# Altium integrated library Supernova Connectors.IntLib: 270 symbols (part 1 of 2) (continued)
## DF40C-40DS-0.4V(51) (continued)

## DF40C-100DS-0.4V(51)
designator J?
CONN RCPT 100POS SMD GOLD; Manufacturer_Name: Hirose; Datasheet Link: https://datasheet.datasheetarchive.com/originals/distributors/SFDatasheet-7/sf-000141247.pdf; Manufacturer_Part_Number: DF40C-100DS-0.4V(51); Mouser Part Number: 798-DF40C100DS0.4V51; Mouser Price/Stock: https://www.mouser.co.uk/ProductDetail/Hirose-Connector/DF40C-100DS-0.4V51?qs=eDUdFcBPps2MEwbnuPvZzQ%3D%3D; Arrow Part Number: DF40C-100DS-0.4V(51); Arrow Price/Stock: https://www.arrow.com/en/products/df40c-100ds-0.4v-51/hirose-electric; Supplier 1: Mouser; Supplier 2: Digi-Key; Supplier Part Number 1: 798-DF40C30DP0.4V51; Supplier Part Number 2: H11622CT-ND
footprint DF40C100DS04V51
pins: 1, 2, 3, 4, 5, 6, 7, 8, 9, 10, 11, 12, 13, 14, 15, 16, 17, 18, 19, 20, 21, 22, 23, 24, 25, 26, 27, 28, 29, 30, 31, 32, 33, 34, 35, 36, 37, 38, 39, 40, 41, 42, 43, 44, 45, 46, 47, 48, 49, 50, 51, 52, 53, 54, 55, 56, 57, 58, 59, 60, 61, 62, 63, 64, 65, 66, 67, 68, 69, 70, 71, 72, 73, 74, 75, 76, 77, 78, 79, 80, 81, 82, 83, 84, 85, 86, 87, 88, 89, 90, 91, 92, 93, 94, 95, 96, 97, 98, 99, 100

## DM3AT-SF-PEJM5
designator J?
Receptacle  Micro SD - Push-Push; Manufacturer: Hirose; Manufacturer Part Number: DM3AT-SF-PEJM5; Supplier 1: Digi-Key; Supplier Part Number 1: HR1964CT-ND; Supplier 2: Mouser; Supplier Part Number 2: 798-DM3AT-SF-PEJM5
footprint HIROSE DM3AT
pins: 1 DAT2, 2 DAT3, 3 CMD, 4 VDD, 5 CLK, 6 VSS, 7 DAT0, 8 DAT1, A CD, B CD, F FIX

## ED555/5DS
designator J?
Header Screw terminal 5 pins; Supplier 1: Digi-Key; Supplier Part Number 1: ED1517-ND; Supplier 2: Newark; Supplier Part Number 2: 85X2493
footprint ED555/5DS
pins: 1, 2, 3, 4, 5

## ESQ-102-37-G-D
designator H?
Header 4 Pin ESQ; System: Connector; Supplier 1: Digi-Key; Supplier Part Number 1: ESQ-102-37-G-D-ND; Supplier 2: Newark; Supplier Part Number 2: 91P8641
footprint ESQ-102-37-G-D
pins: 1, 2, 3, 4

## ESQ-110-23-G-D
designator H?
Header 10x2 pin; Manufacturer_Name: SAMTEC; Manufacturer_Part_Number: ESQ-110-23-L-D; Datasheet Link: http://suddendocs.samtec.com/prints/esq-1xx-xx-x-x-xxx-xx-x-xx-mkt.pdf; Supplier 1: Digi-Key; Supplier Part Number 1: SAM15578-ND
footprint ESQ-110-23-G-D (ESQ-126-37-G-D Samtech 52-pin connector)
footprint ESQ-110-23-G-D - FLIPPED (ESQ-126-37-G-D Samtech 52-pin connector)
pins: 1, 2, 3, 4, 5, 6, 7, 8, 9, 10, 11, 12, 13, 14, 15, 16, 17, 18, 19, 20

## ESQ-110-33-L-D
designator H?
Header 10x2 Pin; Manufacturer_Name: SAMTEC; Manufacturer_Part_Number: SSW-110-01-G-D; Datasheet Link: http://suddendocs.samtec.com/prints/ssw-1xx-xx-xxx-x-xx-xxx-xx-mkt.pdf; Mouser Part Number: 200-SSW11001GD; Mouser Price/Stock: https://www.mouser.co.uk/ProductDetail/Samtec/SSW-110-01-G-D?qs=H3VknL1Rk7SPuUvNV9ez4g%3D%3D; Arrow Part Number: SSW-110-01-G-D; Arrow Price/Stock: https://www.arrow.com/en/products/ssw-110-01-g-d/samtec; Supplier 1: Digi-Key; Supplier Part Number 1: ESQ-110-33-L-D-ND
footprint SSW-110-XX-YYY-D
pins: 1, 2, 3, 4, 5, 6, 7, 8, 9, 10, 11, 12, 13, 14, 15, 16, 17, 18, 19, 20

## ESQ-110-37-G-D
designator H1
Header PC/104 20-pin; System: Connector; Supplier 1: Digi-Key; Supplier Part Number 1: ESQ-110-37-G-D-ND; Supplier 2: Newark; Supplier Part Number 2: 91P9697
footprint ESQ-110-37-G-D (ESQ-126-37-G-D Samtech 52-pin connector)
footprint ESQ-110-37-G-D - flipped (ESQ-126-37-G-D Samtech 52-pin connector)
pins: 1, 2, 3, 4, 5, 6, 7, 8, 9, 10, 11, 12, 13, 14, 15, 16, 17, 18, 19, 20

## ESQ-112-37-G-D
designator H?
Header PC/104 24-pin; System: Connector; Supplier 1: Digi-Key; Supplier Part Number 1: ESQ-112-37-G-D-ND; Supplier 2: Digi-Key; Supplier Part Number 2: ESQ-112-37-S-D-ND
footprint ESQ-112-37-G-D (ESQ-126-37-G-D Samtech 52-pin connector)
footprint ESQ-112-37-G-D - flipped (ESQ-126-37-G-D Samtech 52-pin connector)
pins: 1, 2, 3, 4, 5, 6, 7, 8, 9, 10, 11, 12, 13, 14, 15, 16, 17, 18, 19, 20, 21, 22, 23, 24

## Fiducial
designator FID?  (value not drawn)  (no BOM)
Fiducial Mark
footprint Fiducial
footprint Fiducial - WITH PASTE
pins: 1

## FTS-115-02-L-DV-A
designator H?
Header 30 Pin FTS; System: Connector*; Supplier 1: Mouser; Supplier 2: Digi-Key; Supplier Part Number 1: 200-FTS11502LDVA; Supplier Part Number 2: FTS-115-02-L-DV-A-ND
footprint FTS-115-02-L-DV-A
pins: 1, 2, 3, 4, 5, 6, 7, 8, 9, 10, 11, 12, 13, 14, 15, 16, 17, 18, 19, 20, 21, 22, 23, 24, 25, 26, 27, 28, 29, 30

## FTS-129-02-L-DV-A
designator H?
Header 58 Pin FTS; System: Connector; Supplier 1: Digi-Key; Supplier Part Number 1: FTS-129-02-L-DV-A-ND
footprint FTS-129-02-L-DV-A
pins: 1, 2, 3, 4, 5, 6, 7, 8, 9, 10, 11, 12, 13, 14, 15, 16, 17, 18, 19, 20, 21, 22, 23, 24, 25, 26, 27, 28, 29, 30, 31, 32, 33, 34, 35, 36, 37, 38, 39, 40, 41, 42, 43, 44, 45, 46, 47, 48, 49, 50, 51, 52, 53, 54, 55, 56, 57, 58

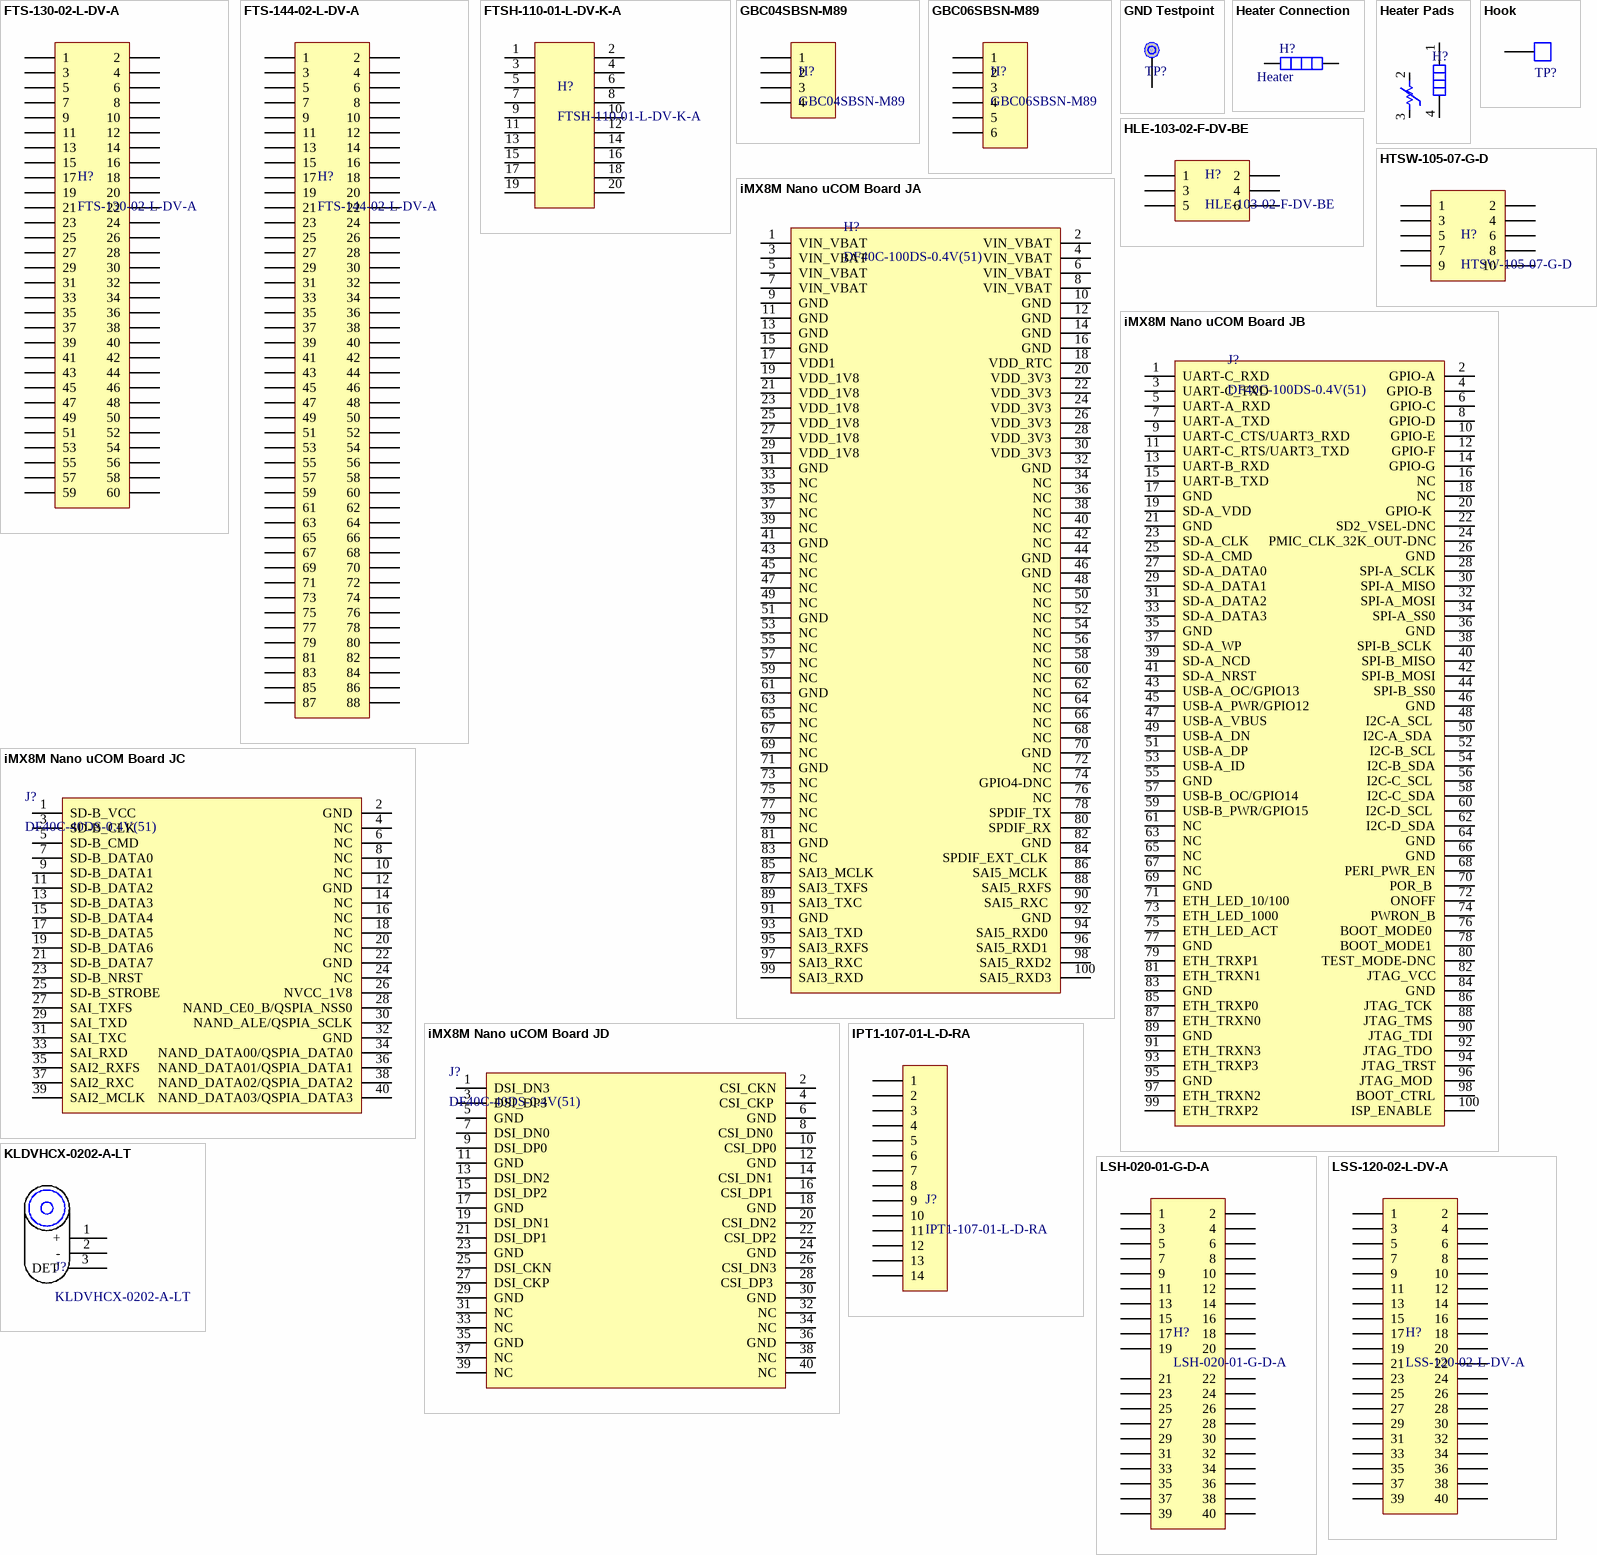
[diagram p4: symbols FTS-130-02-L-DV-A to LSS-120-02-L-DV-A]

## FTS-130-02-L-DV-A
designator H?
Header 60 Pin FTS; System: Connector; Supplier 1: Avnet; Supplier Part Number 1: FTS-130-02-L-DV-A; Supplier 2: Digi-Key; Supplier Part Number 2: FTS-130-02-L-DV-A-ND; Supplier 3: Newark; Supplier Part Number 3: 96AC0110; Supplier 4: Mouser; Supplier Part Number 4: 200-FTS13002LDVA; Supplier 5: Avnet; Supplier Part Number 5: FTS-130-02-L-DV; Supplier 6: Samtec; Supplier Part Number 6: FTS-130-02-L-DV
footprint FTS-130-02-L-DV-A
pins: 1, 2, 3, 4, 5, 6, 7, 8, 9, 10, 11, 12, 13, 14, 15, 16, 17, 18, 19, 20, 21, 22, 23, 24, 25, 26, 27, 28, 29, 30, 31, 32, 33, 34, 35, 36, 37, 38, 39, 40, 41, 42, 43, 44, 45, 46, 47, 48, 49, 50, 51, 52, 53, 54, 55, 56, 57, 58, 59, 60

## FTS-144-02-L-DV-A
designator H?
Header 88 Pin FTS; System: Connector; Supplier 1: Digi-Key; Supplier 2: Digi-Key; Supplier Part Number 1: FTS-144-02-FM-DV-ND; Supplier Part Number 2: FTS-144-02-S-DV-ND
footprint FTS-144-02-L-DV-A
pins: 1, 2, 3, 4, 5, 6, 7, 8, 9, 10, 11, 12, 13, 14, 15, 16, 17, 18, 19, 20, 21, 22, 23, 24, 25, 26, 27, 28, 29, 30, 31, 32, 33, 34, 35, 36, 37, 38, 39, 40, 41, 42, 43, 44, 45, 46, 47, 48, 49, 50, 51, 52, 53, 54, 55, 56, 57, 58, 59, 60, 61, 62, 63, 64, 65, 66, 67, 68, 69, 70, 71, 72, 73, 74, 75, 76, 77, 78, 79, 80, 81, 82, 83, 84, 85, 86, 87, 88

## FTSH-110-01-L-DV-K-A
designator H?
Header 10x2 50mil SMD; System: Connector; Supplier 1: Digi-Key; Supplier 2: Digi-Key; Supplier 3: Digi-Key; Supplier Part Number 1: SAM11271-ND; Supplier Part Number 2: SAM13176CT-ND; Supplier Part Number 3: SAM11270-ND
footprint FTSH-110-01-L-DV-K-A
pins: 1, 2, 3, 4, 5, 6, 7, 8, 9, 10, 11 1, 12, 13, 14, 15, 16, 17, 18, 19, 20

## GBC04SBSN-M89
designator H?
Header 4x1 RA SMT; System: Connector; Supplier 1: Digi-Key; Supplier Part Number 1: S1133E-04-ND; Supplier 2: Digi-Key; Supplier Part Number 2: SAM12999-ND
footprint HDR 4pin RA SMT
footprint HDR 4pin RA SMT - SM Defined
pins: 1, 2, 3, 4

## GBC06SBSN-M89
designator H?
Header 6x1 RA SMT; System: Connector; Supplier 1: Digi-Key; Supplier Part Number 1: S1133E-06-ND
footprint HDR 6pin RA SMT
pins: 1, 2, 3, 4, 5, 6

## GND Testpoint
designator TP?  (value not drawn)  (no BOM)
Testpoint GND
footprint GND Testpoint
pins: 1

## Heater Connection
designator H?, comment Heater  (no BOM)
Heater Connection; System: Connector; Revision: Altium ETH 11-03.2008
footprint Heater Pads TH
pins: 1, 2
1 alternate drawing of the same symbol

## Heater Pads
designator H?, comment Heater + Thermistor  (value not drawn)  (no BOM)
System: Connector
footprint Heater Pads - smaller
footprint Heater Pads
footprint Heater Pads - LEFT
pins: 1, 2, 3, 4

## HLE-103-02-F-DV-BE
designator H?
Header 3x2 SMD pass-through; System: Connector; Supplier 1: Digi-Key; Supplier Part Number 1: HLE-103-02-S-DV-BE-ND; Supplier 2: Digi-Key; Supplier Part Number 2: SAM13984CT-ND
footprint HLE-103-02-F-DV-BE
pins: 1, 2, 3, 4, 5, 6

## Hook
designator TP?  (value not drawn)
Testpoint Hook; Manufacturer: Keystone Electronics; Manufacturer Part Number: 5016; Mass_g: 0.11; Supplier 1 Pricing: 0.60 (NZD); Supplier 1: Digi-Key; Supplier Part Number 1: 36-5016CT-ND; Supplier 2: Digi-Key; Supplier Part Number 2: 36-5018CT-ND
footprint Hook
pins: 1 Hook

## HTSW-105-07-G-D
designator H?
Header 5x2 TH; System: Connector; Supplier 1: Digi-Key; Supplier Part Number 1: SAM10538-ND; Supplier 2: Newark; Supplier 3: Digi-Key; Supplier Part Number 2: 12P1454; Supplier Part Number 3: SAM1028-05-ND
footprint 5x2 0.100" header
pins: 1, 2, 3, 4, 5, 6, 7, 8, 9, 10

## iMX8M Nano uCOM Board JA
designator H?, comment DF40C-100DS-0.4V(51)
CONN RCPT 100POS SMD GOLD; Manufacturer_Name: Hirose; Datasheet Link: https://datasheet.datasheetarchive.com/originals/distributors/SFDatasheet-7/sf-000141247.pdf; Manufacturer_Part_Number: DF40C-100DS-0.4V(51); Mouser Part Number: 798-DF40C100DS0.4V51; Mouser Price/Stock: https://www.mouser.co.uk/ProductDetail/Hirose-Connector/DF40C-100DS-0.4V51?qs=eDUdFcBPps2MEwbnuPvZzQ%3D%3D; Arrow Part Number: DF40C-100DS-0.4V(51); Arrow Price/Stock: https://www.arrow.com/en/products/df40c-100ds-0.4v-51/hirose-electric; Supplier 1: Mouser; Supplier 2: Digi-Key; Supplier Part Number 1: 798-DF40C30DP0.4V51; Supplier Part Number 2: H11622CT-ND
footprint DF40C100DS04V51
pins: 1 VIN_VBAT, 2 VIN_VBAT, 3 VIN_VBAT, 4 VIN_VBAT, 5 VIN_VBAT, 6 VIN_VBAT, 7 VIN_VBAT, 8 VIN_VBAT, 9 GND, 10 GND, 11 GND, 12 GND, 13 GND, 14 GND, 15 GND, 16 GND, 17 VDD1, 18 VDD_RTC, 19 VDD_1V8, 20 VDD_3V3, 21 VDD_1V8, 22 VDD_3V3, 23 VDD_1V8, 24 VDD_3V3, 25 VDD_1V8, 26 VDD_3V3, 27 VDD_1V8, 28 VDD_3V3, 29 VDD_1V8, 30 VDD_3V3, 31 GND, 32 GND, 33 NC, 34 NC, 35 NC, 36 NC, 37 NC, 38 NC, 39 NC, 40 NC, 41 GND, 42 NC, 43 NC, 44 GND, 45 NC, 46 GND, 47 NC, 48 NC, 49 NC, 50 NC, 51 GND, 52 NC, 53 NC, 54 NC, 55 NC, 56 NC, 57 NC, 58 NC, 59 NC, 60 NC, 61 GND, 62 NC, 63 NC, 64 NC, 65 NC, 66 NC, 67 NC, 68 NC, 69 NC, 70 GND, 71 GND, 72 NC, 73 NC, 74 GPIO4-DNC, 75 NC, 76 NC, 77 NC, 78 SPDIF_TX, 79 NC, 80 SPDIF_RX, 81 GND, 82 GND, 83 NC, 84 SPDIF_EXT_CLK , 85 SAI3_MCLK , 86 SAI5_MCLK , 87 SAI3_TXFS , 88 SAI5_RXFS, 89 SAI3_TXC, 90 SAI5_RXC , 91 GND, 92 GND, 93 SAI3_TXD , 94 SAI5_RXD0 , 95 SAI3_RXFS , 96 SAI5_RXD1 , 97 SAI3_RXC , 98 SAI5_RXD2, 99 SAI3_RXD , 100 SAI5_RXD3

## iMX8M Nano uCOM Board JB
designator J?, comment DF40C-100DS-0.4V(51)
CONN RCPT 100POS SMD GOLD; Manufacturer_Name: Hirose; Datasheet Link: https://datasheet.datasheetarchive.com/originals/distributors/SFDatasheet-7/sf-000141247.pdf; Manufacturer_Part_Number: DF40C-100DS-0.4V(51); Mouser Part Number: 798-DF40C100DS0.4V51; Mouser Price/Stock: https://www.mouser.co.uk/ProductDetail/Hirose-Connector/DF40C-100DS-0.4V51?qs=eDUdFcBPps2MEwbnuPvZzQ%3D%3D; Arrow Part Number: DF40C-100DS-0.4V(51); Arrow Price/Stock: https://www.arrow.com/en/products/df40c-100ds-0.4v-51/hirose-electric; Supplier 1: Mouser; Supplier 2: Digi-Key; Supplier Part Number 1: 798-DF40C30DP0.4V51; Supplier Part Number 2: H11622CT-ND
footprint DF40C100DS04V51
pins: 1 UART-C_RXD, 2 GPIO-A, 3 UART-C_TXD, 4 GPIO-B , 5 UART-A_RXD, 6 GPIO-C, 7 UART-A_TXD, 8 GPIO-D, 9 UART-C_CTS/UART3_RXD, 10 GPIO-E, 11 UART-C_RTS/UART3_TXD, 12 GPIO-F, 13 UART-B_RXD , 14 GPIO-G, 15 UART-B_TXD, 16 NC, 17 GND, 18 NC, 19 SD-A_VDD , 20 GPIO-K , 21 GND, 22 SD2_VSEL-DNC, 23 SD-A_CLK, 24 PMIC_CLK_32K_OUT-DNC, 25 SD-A_CMD, 26 GND, 27 SD-A_DATA0, 28 SPI-A_SCLK, 29 SD-A_DATA1, 30 SPI-A_MISO, 31 SD-A_DATA2, 32 SPI-A_MOSI, 33 SD-A_DATA3, 34 SPI-A_SS0, 35 GND, 36 GND, 37 SD-A_WP, 38 SPI-B_SCLK , 39 SD-A_NCD, 40 SPI-B_MISO, 41 SD-A_NRST, 42 SPI-B_MOSI, 43 USB-A_OC/GPIO13 , 44 SPI-B_SS0, 45 USB-A_PWR/GPIO12 , 46 GND, 47 USB-A_VBUS, 48 I2C-A_SCL , 49 USB-A_DN, 50 I2C-A_SDA , 51 USB-A_DP, 52 I2C-B_SCL, 53 USB-A_ID , 54 I2C-B_SDA, 55 GND, 56 I2C-C_SCL , 57 USB-B_OC/GPIO14, 58 I2C-C_SDA, 59 USB-B_PWR/GPIO15, 60 I2C-D_SCL , 61 NC, 62 I2C-D_SDA, 63 NC, 64 GND, 65 NC, 66 GND, 67 NC, 68 PERI_PWR_EN, 69 GND, 70 POR_B , 71 ETH_LED_10/100 , 72 ONOFF, 73 ETH_LED_1000 , 74 PWRON_B, 75 ETH_LED_ACT , 76 BOOT_MODE0 , 77 GND, 78 BOOT_MODE1 , 79 ETH_TRXP1, 80 TEST_MODE-DNC, 81 ETH_TRXN1 , 82 JTAG_VCC, 83 GND, 84 GND, 85 ETH_TRXP0, 86 JTAG_TCK , 87 ETH_TRXN0 , 88 JTAG_TMS , 89 GND, 90 JTAG_TDI , 91 ETH_TRXN3, 92 JTAG_TDO , 93 ETH_TRXP3 , 94 JTAG_TRST, 95 GND, 96 JTAG_MOD , 97 ETH_TRXN2, 98 BOOT_CTRL, 99 ETH_TRXP2 , 100 ISP_ENABLE 

## iMX8M Nano uCOM Board JC
designator J?, comment DF40C-40DS-0.4V(51)
CONN RCPT 40POS SMD GOLD; Manufacturer_Name: Hirose; Datasheet Link: https://www.hirose.com/product/download/?distributor=digikey&type=2d&lang=en&num=DF40C-40DS-0.4V(51); Height: 1.65mm; Manufacturer_Part_Number: DF40C-40DS-0.4V(51); Mouser Part Number: 798-DF40C40DS0.4V51; Mouser Price/Stock: https://www.mouser.co.uk/ProductDetail/Hirose-Connector/DF40C-40DS-0.4V51?qs=eDUdFcBPps3TglLeCFrcgA%3D%3D; Arrow Part Number: DF40C-40DS-0.4V(51); Arrow Price/Stock: https://www.arrow.com/en/products/df40c-40ds-0.4v-51/hirose-electric; Supplier 1: Digi-Key; Supplier 2: Mouser; Supplier Part Number 1: H11625CT-ND; Supplier Part Number 2: 798-DF40C40DS0.4V51
footprint DF40C40DS04V51 42 pins
footprint DF40C40DS04V51
pins: 1 SD-B_VCC, 2 GND, 3 SD-B_CLK, 4 NC, 5 SD-B_CMD , 6 NC, 7 SD-B_DATA0 , 8 NC, 9 SD-B_DATA1, 10 NC, 11 SD-B_DATA2 , 12 GND, 13 SD-B_DATA3, 14 NC, 15 SD-B_DATA4, 16 NC, 17 SD-B_DATA5, 18 NC, 19 SD-B_DATA6, 20 NC, 21 SD-B_DATA7, 22 GND, 23 SD-B_NRST, 24 NC, 25 SD-B_STROBE, 26 NVCC_1V8, 27 SAI_TXFS, 28 NAND_CE0_B/QSPIA_NSS0, 29 SAI_TXD, 30 NAND_ALE/QSPIA_SCLK, 31 SAI_TXC, 32 GND, 33 SAI_RXD , 34 NAND_DATA00/QSPIA_DATA0, 35 SAI2_RXFS, 36 NAND_DATA01/QSPIA_DATA1, 37 SAI2_RXC, 38 NAND_DATA02/QSPIA_DATA2, 39 SAI2_MCLK, 40 NAND_DATA03/QSPIA_DATA3

## iMX8M Nano uCOM Board JD
designator J?, comment DF40C-40DS-0.4V(51)
CONN RCPT 40POS SMD GOLD; Manufacturer_Name: Hirose; Datasheet Link: https://www.hirose.com/product/download/?distributor=digikey&type=2d&lang=en&num=DF40C-40DS-0.4V(51); Height: 1.65mm; Manufacturer_Part_Number: DF40C-40DS-0.4V(51); Mouser Part Number: 798-DF40C40DS0.4V51; Mouser Price/Stock: https://www.mouser.co.uk/ProductDetail/Hirose-Connector/DF40C-40DS-0.4V51?qs=eDUdFcBPps3TglLeCFrcgA%3D%3D; Arrow Part Number: DF40C-40DS-0.4V(51); Arrow Price/Stock: https://www.arrow.com/en/products/df40c-40ds-0.4v-51/hirose-electric; Supplier 1: Digi-Key; Supplier 2: Mouser; Supplier Part Number 1: H11625CT-ND; Supplier Part Number 2: 798-DF40C40DS0.4V51
footprint DF40C40DS04V51 42 pins
footprint DF40C40DS04V51
pins: 1 DSI_DN3, 2 CSI_CKN, 3 DSI_DP3 , 4 CSI_CKP , 5 GND, 6 GND, 7 DSI_DN0, 8 CSI_DN0 , 9 DSI_DP0, 10 CSI_DP0, 11 GND, 12 GND, 13 DSI_DN2 , 14 CSI_DN1 , 15 DSI_DP2, 16 CSI_DP1 , 17 GND, 18 GND, 19 DSI_DN1 , 20 CSI_DN2, 21 DSI_DP1 , 22 CSI_DP2, 23 GND, 24 GND, 25 DSI_CKN, 26 CSI_DN3, 27 DSI_CKP, 28 CSI_DP3 , 29 GND, 30 GND, 31 NC, 32 NC, 33 NC, 34 NC, 35 GND, 36 GND, 37 NC, 38 NC, 39 NC, 40 NC

## IPT1-107-01-L-D-RA
designator J?
Header Side Panel IPT1-107-01-L-D-RA; System: Connector; Supplier 1: Digi-Key; Supplier Part Number 1: SAM11441-ND; Supplier 2: Newark; Supplier Part Number 2: 56AC5745
footprint IPT1-107-01-L-D-RA
pins: 1, 2, 3, 4, 5, 6, 7, 8, 9, 10, 11, 12, 13, 14

## KLDVHCX-0202-A-LT
designator J?
Header Barrel Vertical; Supplier 1: Digi-Key; Supplier 2: Mouser; Supplier Part Number 1: 2092-KLDVHCX-0202-A-LT-ND; Supplier Part Number 2: 806-KLDVHCX0202-A-LT
footprint KLDVHCX-0202-A-LT
pins: 1 +, 2 -, 3 DET

## LSH-020-01-G-D-A
designator H?
Header 40 Pin LSH; System: Connector; Supplier 1: Digi-Key; Supplier 2: Mouser; Supplier 3: Digi-Key; Supplier Part Number 1: SAM9670-ND; Supplier Part Number 2: 200-LSH02001GDA; Supplier Part Number 3: SAM15427CT-ND
footprint LSH-020-01-G-D-A
pins: 1, 2, 3, 4, 5, 6, 7, 8, 9, 10, 11, 12, 13, 14, 15, 16, 17, 18, 19, 20, 21, 22, 23, 24, 25, 26, 27, 28, 29, 30, 31, 32, 33, 34, 35, 36, 37, 38, 39, 40

## LSS-120-02-L-DV-A
designator H?
Header 40 Pin LSS 6mm; System: Connector; Supplier 1: Digi-Key; Supplier Part Number 1: SAM9677-ND; Supplier 2: Newark; Supplier 3: Digi-Key; Supplier Part Number 2: 85T5354; Supplier Part Number 3: SAM11458-ND
footprint LLS-120-02-L-DV-A (40 pin hermapheroditic connector)
pins: 1, 2, 3, 4, 5, 6, 7, 8, 9, 10, 11, 12, 13, 14, 15, 16, 17, 18, 19, 20, 21, 22, 23, 24, 25, 26, 27, 28, 29, 30, 31, 32, 33, 34, 35, 36, 37, 38, 39, 40

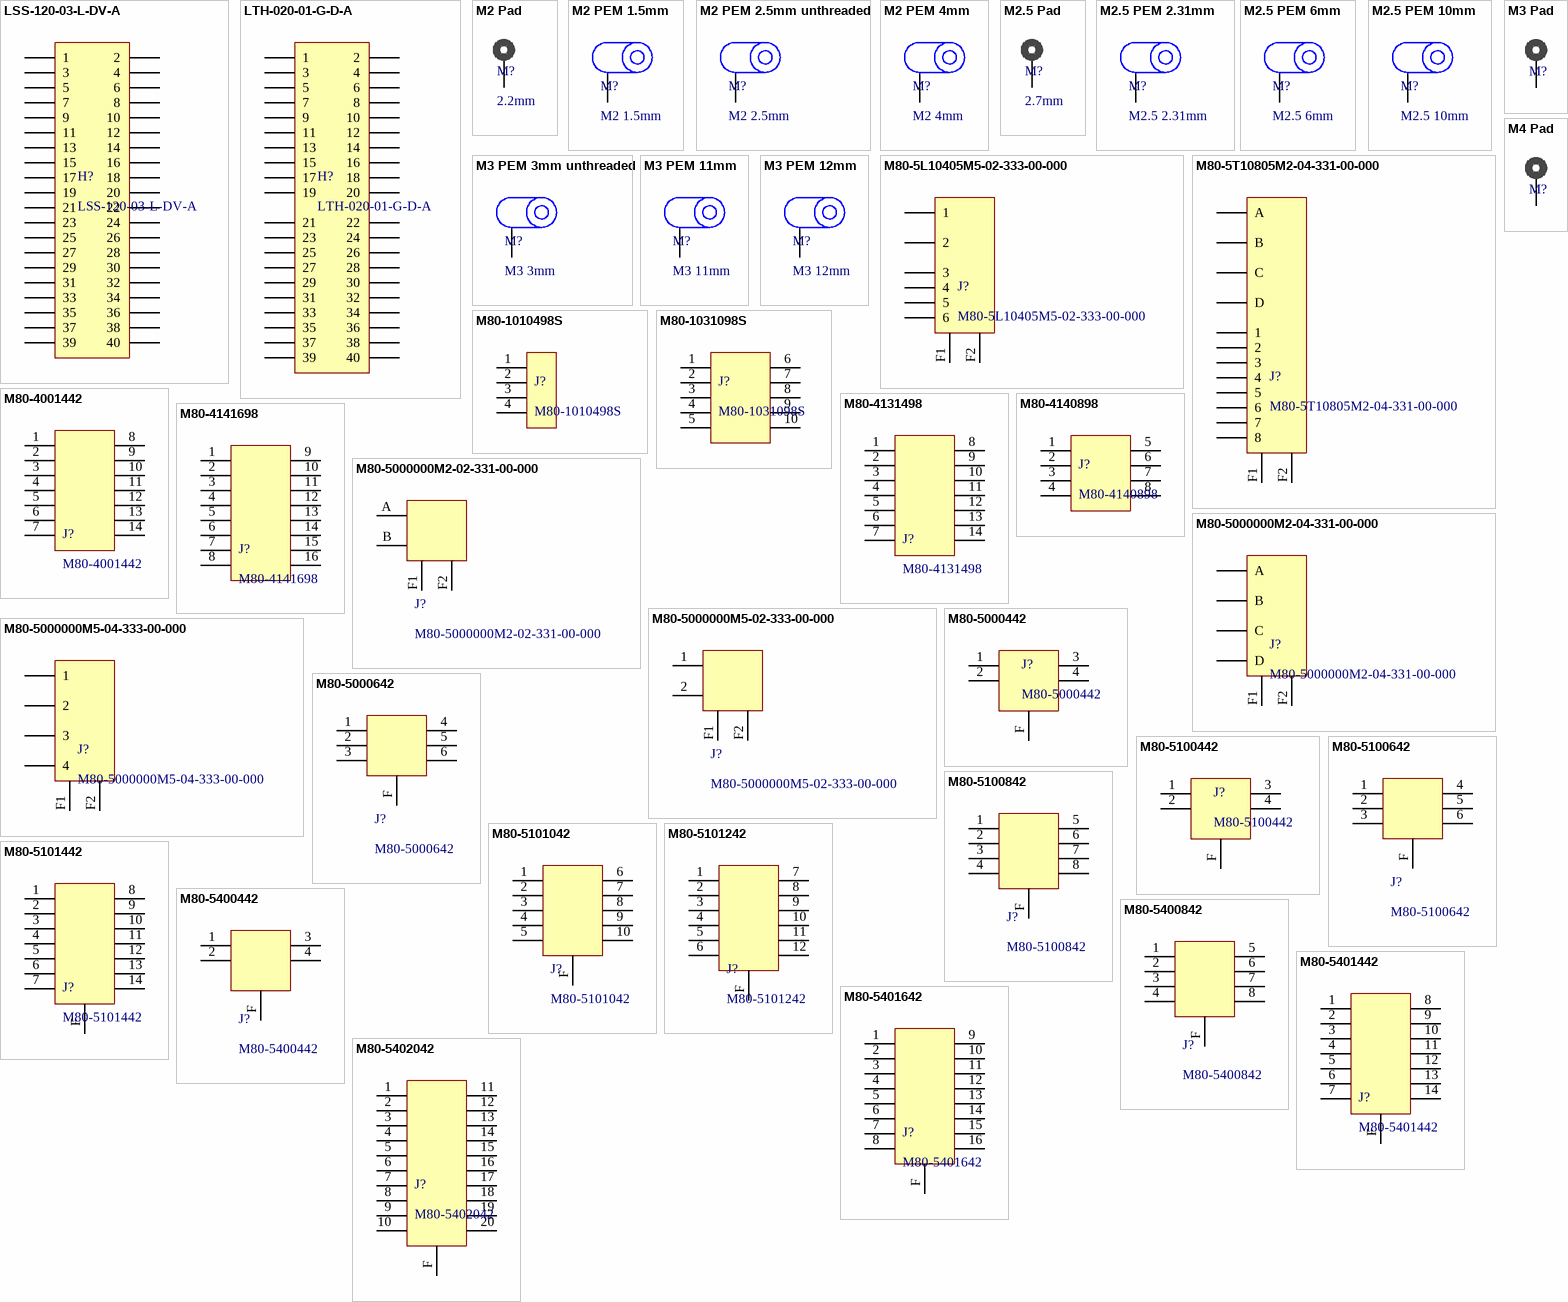
[diagram p5: symbols LSS-120-03-L-DV-A to M80-5402042]

## LSS-120-03-L-DV-A
designator H?
Header 40 Pin LSS 4mm; System: Connector; Supplier 1: Digi-Key; Supplier Part Number 1: SAM9678-ND; Supplier 2: Newark; Supplier 3: Digi-Key; Supplier Part Number 2: 85T5356; Supplier Part Number 3: LSS-120-03-L-DV-A-K-ND
footprint LLS-120-03-L-DV-A (40 pin hermapheroditic connector)
pins: 1, 2, 3, 4, 5, 6, 7, 8, 9, 10, 11, 12, 13, 14, 15, 16, 17, 18, 19, 20, 21, 22, 23, 24, 25, 26, 27, 28, 29, 30, 31, 32, 33, 34, 35, 36, 37, 38, 39, 40

## LTH-020-01-G-D-A
designator H?
Header 40 Pin LTH; System: Connector; Supplier 1: Digi-Key; Supplier 2: Mouser; Supplier 3: Digi-Key; Supplier Part Number 1: SAM12691-ND; Supplier Part Number 2: 200-LTH02001GDA; Supplier Part Number 3: SAM14178CT-ND
footprint LTH-020-01-G-D-A
pins: 1, 2, 3, 4, 5, 6, 7, 8, 9, 10, 11, 12, 13, 14, 15, 16, 17, 18, 19, 20, 21, 22, 23, 24, 25, 26, 27, 28, 29, 30, 31, 32, 33, 34, 35, 36, 37, 38, 39, 40

## M2 Pad
designator M?, comment 2.2mm  (no BOM)
Mounting Hole for M2 fasteners; System: Connector
footprint M2 HOLE
footprint M2 HOLE - single layer
footprint M2 HOLE - single layer - SM Defined
footprint M2 HOLE - SMALL - single layer - SM Defined
footprint M2 HOLE - tiny - single layer
footprint M2 HOLE - SMALL
footprint M2 HOLE - SMALL - Small Bottom
footprint M2 HOLE - RRI
pins: 1

## M2 PEM 1.5mm
designator M?, comment M2 1.5mm
PEM, M2 1.5mm; System: Connector; Supplier 1: Mouser; Supplier Part Number 1: 710-9774015243R; Supplier 2: Digi-Key; Supplier Part Number 2: 732-7069-1-ND
footprint M2 PEM 1.5mm (2.5mm M2 PEM)
footprint M2 PEM 1.5mm - NPTH (2.5mm M2 PEM)
pins: 1

## M2 PEM 2.5mm unthreaded
designator M?, comment M2 2.5mm
PEM, M2 2.5mm unthreaded; System: Connector; Supplier 1: Digi-Key; Supplier Part Number 1: 732-10939-1-ND; Supplier 2: Mouser; Supplier Part Number 2: 710-9774025943R
footprint M2 PEM 2.5mm (2.5mm M2 PEM)
footprint M2 PEM 2.5mm - NPTH (2.5mm M2 PEM)
pins: 1

## M2 PEM 4mm
designator M?, comment M2 4mm
PEM, M2 4mm; System: Connector; Supplier 1: Digi-Key; Supplier 2: Mouser; Supplier Part Number 2: 710-9774040243R; Supplier Part Number 1: 732-7090-1-ND
footprint M2 PEM 4mm (4mm M2 PEM)
footprint M2 PEM 4mm - NPTH (4mm M2 PEM)
pins: 1

## M2.5 Pad
designator M?, comment 2.7mm  (no BOM)
Mounting Hole for M2.5 fasteners; System: Connector
footprint M2.5 Hole
footprint M2.5 Hole - top-bottom
pins: 1

## M2.5 PEM 2.31mm
designator M?, comment M2.5 2.31mm
PEM, M2.5 2.31mm; Manufacturer Part Number 1: None; System: Connector
footprint M2.5 PEM 2.31mm (2.31mm M2.5 PEM)
footprint M2.5 PEM 2.31mm - NPTH (2.31mm M2.5 PEM)
pins: 1

## M2.5 PEM 6mm
designator M?, comment M2.5 6mm
PEM, M2.5 6mm; System: Connector; Supplier 1: Digi-Key; Supplier 2: Mouser; Supplier Part Number 1: 732-7102-1-ND; Supplier Part Number 2: 710-9774060151R
footprint M2.5 PEM 6mm (6mm M2.5 PEM)
footprint M2.5 PEM 6mm - NPTH (6mm M2.5 PEM)
pins: 1

## M2.5 PEM 10mm
designator M?, comment M2.5 10mm
PEM, M2.5 10mm; System: Connector; Supplier 1: Mouser; Supplier Part Number 1: 710-9774100151R; Supplier 2: Digi-Key; Supplier Part Number 2: 732-7117-1-ND
footprint M2.5 PEM 10mm (10mm M2.5 PEM)
pins: 1

## M3 Pad
designator M?, comment 3.2mm  (value not drawn)  (no BOM)
Mounting Hole for M3 fasteners; System: Connector
footprint M3 HOLE
footprint M3 HOLE - TOP
footprint M3 HOLE - TOP+BOTTOM
pins: 1

## M3 PEM 3mm unthreaded
designator M?, comment M3 3mm
PEM, M3 3mm unthreaded; System: Connector; Supplier 1: Mouser; Supplier Part Number 1: 710-9774030960R; Supplier 2: Digi-Key; Supplier Part Number 2: 732-7087-1-ND
footprint 3mm PEM 3mm
pins: 1

## M3 PEM 11mm
designator M?, comment M3 11mm
PEM, M3 11mm; System: Connector; Supplier 1: Digi-Key; Supplier Part Number 1: 732-5278-1-ND; Supplier 2: Mouser; Supplier Part Number 2: 710-9774110360R
footprint M3 PEM 11mm
footprint M3 PEM 11mm - NPTH
pins: 1

## M3 PEM 12mm
designator M?, comment M3 12mm
PEM, M3 12mm; System: Connector; Supplier 1: Digi-Key; Supplier Part Number 1: 732-5279-1-ND; Supplier 2: Mouser; Supplier Part Number 2: 710-9774120360R
footprint M3 PEM 12mm
footprint M3 PEM 12mm - NPTH
pins: 1

## M4 Pad
designator M?, comment 4.4mm  (value not drawn)  (no BOM)
Mounting Hole for M4 fasteners; System: Connector
footprint M4 HOLE
pins: 1

## M80-5L10405M5-02-333-00-000
designator J?
Header M80 2POS Power + 4signal RA Screw-lock; System: Connector; Supplier 1: Mouser; Supplier Part Number 1: 855-M805L10405M50233; Supplier 2: Digi-Key; Supplier Part Number 2: 952-2923-ND; Supplier 3: Farnell; Supplier Part Number 3: 2853745
footprint M80-5L10405M5-02-333-00-000
pins: 1, 2, 3, 4, 5, 6, F1 F, F2 F

## M80-5T10805M2-04-331-00-000
designator J?
Header M80 4POS Power + 8signal Screw-lock; System: Connector; Supplier 1: Mouser; Supplier Part Number 1: 855-M805L10405M50233; Supplier 2: Digi-Key; Supplier Part Number 2: 952-2923-ND; Supplier 3: Farnell; Supplier Part Number 3: 2853745
footprint M80-5T10805M2-04-331-00-000 - no silk
footprint M80-5T10805M2-04-331-00-000
footprint M80-5T10805M2-04-331-00-000 - no silk - nuts
pins: 1, 2, 3, 4, 5, 6, 7, 8, A, B, C, D, F1 F, F2 F

## M80-1010498S
designator J?
Housing M80 4POS Latch-lock Single Row; Value: 14 Power Pins; Package / Case: THT, RA; Operating Temperature: -55°C ~ 85°C; Supplier 1: Digi-Key; Supplier 2: Mouser; Supplier Part Number 1: 952-3521-ND; Supplier Part Number 2: 855-M80-1010498S
pins: 1, 2, 3, 4

## M80-1031098S
designator J?
Housing M80 10POS Latch-lock; Value: 14 Power Pins; Package / Case: THT, RA; Operating Temperature: -55°C ~ 85°C; Supplier 1: Mouser; Supplier 2: Digi-Key; Supplier Part Number 1: 855-M80-1031098S; Supplier Part Number 2: 952-3527-ND
pins: 1, 2, 3, 4, 5, 6, 7, 8, 9, 10

## M80-4001442
designator J?
Header M80 14POS Vertical Screw-lock Female; Manufacturer: Harwin; Manufacturer Part Number: M80-5101442; Value: 14 Power Pins; System: Connector; Package / Case: THT, RA; Operating Temperature: -55°C ~ 85°C; Supplier 1: Mouser; Supplier Part Number 1: 855-M80-5101405; Supplier 2: Digi-Key; Supplier 3: Mouser; Supplier Part Number 2: 952-1886-ND; Supplier Part Number 3: 855-M80-4001442
footprint M80-4001442
pins: 1, 2, 3, 4, 5, 6, 7, 8, 9, 10, 11, 12, 13, 14